# Altium footprint library Minh_Lib.PcbLib: 141 footprints (part 4 of 9)
Each footprint in its own frame and in the unit in brackets; x right, y up, seen from the top. Pads: shape width x height; smd on the part's side, far side on the other; paste and mask are expansions set on the pad; w line width, h text height; cw(c..) or ccw(c..) is an arc to the next point about the centre after c.
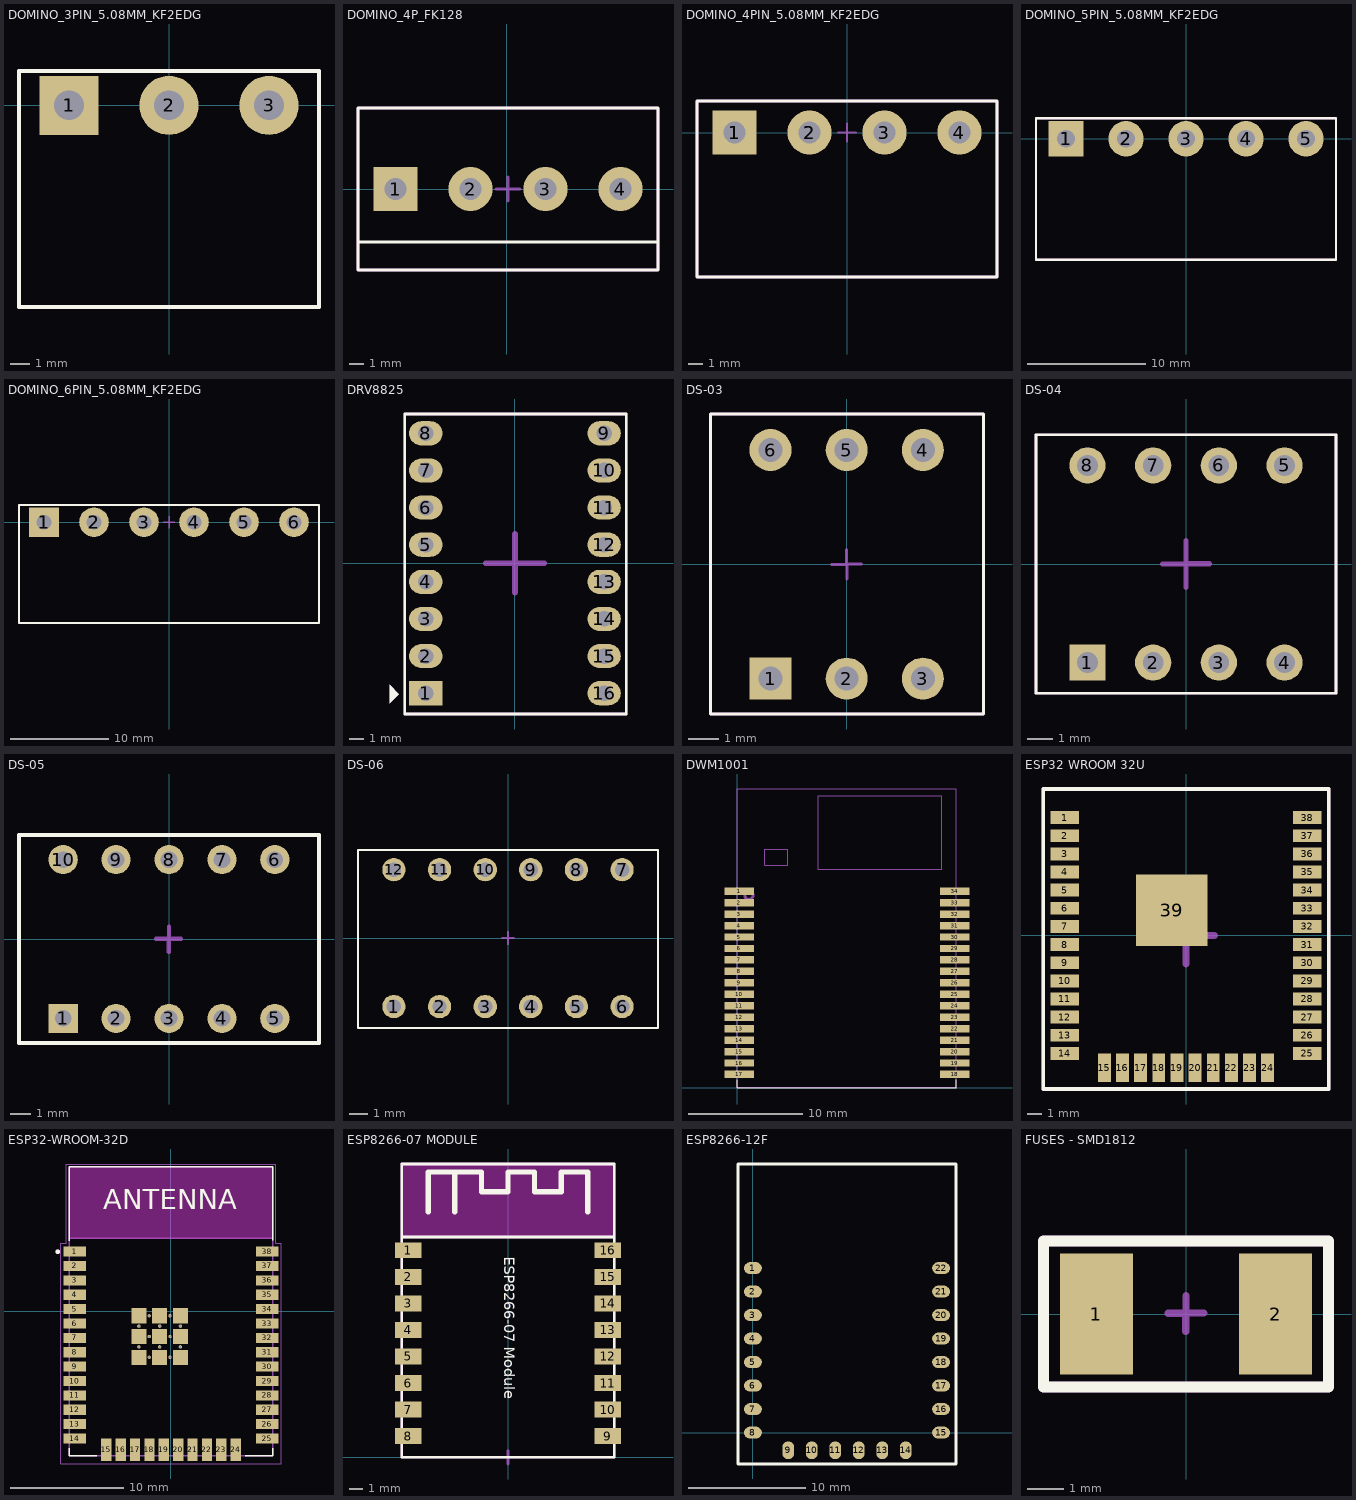
[diagram p3: the footprints below, top view; thin cyan lines are the x and y axes]

## DOMINO_3PIN_5.08MM_KF2EDG [mm] "KF2EDG"
pads (5):
  rect 3x3 hole 1.5: 1(-5.08,0) 1(-5.08,0)
  round 3 hole 1.5: 2(0,0) 2(0,0) 3(5.08,0)
Top Overlay:
  lines w0.2: -7.62,-10.25 7.62,-10.25 7.62,1.75 -7.62,1.75 -7.62,-10.25
Mechanical 13:
  lines w0.2: -7.62,-10.25 7.62,-10.25 7.62,1.75 -7.62,1.75 -7.62,-10.25
  text "'.Designator'" at -7.52,-4.58 h1.2
Mechanical 15:
  lines w0.15: -0.598,-0.002 0.002,-0.002 ; 0,-0.6 0,0 0,0.6 ; 0,-0.002 0.6,-0.002
3D body "User Library-BigHeader 5EHDR_1P.step": height 3.15, standoff -9.32, extent 2.58,-10.25 7.58,1.75
3D body "User Library-BigHeader 5EHDR_1P.step": height 3.15, standoff -9.32, extent -2.5,-10.25 2.5,1.75
3D body "User Library-BigHeader 5EHDR_1P.step": height 3.15, standoff -9.32, extent -7.58,-10.25 -2.58,1.75

## DOMINO_4P_FK128 [mm] "DOMINO 3P FK128"
pads (4):
  rect 3x3 hole 1.5: 1(-7.52,0)
  round 3 hole 1.5: 2(-2.44,0) 3(2.64,0) 4(7.72,0)
Top Overlay:
  lines w0.2: -10,-3.6 10.2,-3.6 ; -10.06,-5.5 10.26,-5.5 10.26,5.5 -10.06,5.5 -10.06,-5.5
Mechanical 13:
  lines w0.2: -10.06,-5.5 10.26,-5.5 10.26,5.5 -10.06,5.5 -10.06,-5.5
  text "'.Designator'" at -9.96,-4.58 h1.2
Mechanical 15:
  lines w0.2: -0.7,0 0.1,0 ; 0.1,-0.8 0.1,0 ; 0.1,0.8 0.1,0 ; 0.9,0 0.1,0
3D body "KF128-5.08-4P.STEP": height 14.16, standoff -3.79, extent -10.42,-5.15 10.5,5.15

## DOMINO_4PIN_5.08MM_KF2EDG [mm] "KF2EDG"
pads (6):
  rect 3x3 hole 1.5: 1(-7.62,0) 1(-7.62,0)
  round 3 hole 1.5: 2(-2.54,0) 2(-2.54,0) 3(2.54,0) 4(7.62,0)
Top Overlay:
  lines w0.2: -10.16,-9.8 10.16,-9.8 10.16,2.15 -10.16,2.15 -10.16,-9.8
Mechanical 13:
  lines w0.2: -10.16,-9.8 10.16,-9.8 10.16,2.15 -10.16,2.15 -10.16,-9.8
  text "'.Designator'" at -9.55,-8.15 h1.5
Mechanical 15:
  lines w0.15: -0.598,-0.002 0.002,-0.002 ; 0,-0.6 0,0 0,0.6 ; 0,-0.002 0.6,-0.002
3D body "Header 200mil.STEP": height 8.3, standoff -3.9, extent -0.01,-9.94 10.15,2.06
3D body "Header 200mil.STEP": height 8.3, standoff -3.9, extent -10.16,-9.94 0,2.06
3D body "Plug 200mil.STEP": height 14.95, standoff -0.05, extent -10.15,-18.95 0.01,-0.75
3D body "Plug 200mil.STEP": height 14.95, standoff -0.05, extent 0,-18.95 10.16,-0.75

## DOMINO_5PIN_5.08MM_KF2EDG [mm] "KF2EDG"
pads (7):
  rect 3x3 hole 1.5: 1(-10.16,0) 1(-10.16,0)
  round 3 hole 1.5: 2(-5.08,0) 2(-5.08,0) 3(0,0) 4(5.08,0) 5(10.16,0)
Top Overlay:
  lines w0.2: 12.7,-7.62 12.7,0 ; 12.7,-7.25 12.7,-10.25 -12.7,-10.25 -12.7,1.75 12.7,1.75 12.7,-1.25
Mechanical 13:
  lines w0.2: -12.7,-10.252 -12.7,1.748 12.7,1.748 12.7,-10.252 -12.7,-10.252
  text "'.Designator'" at -12.6,-4.48 h1.5
Mechanical 15:
  lines w0.15: -0.598,-0.002 0.002,-0.002 ; 0,-0.6 0,0 0,0.6 ; 0,-0.002 0.6,-0.002
3D body "User Library-BigHeader 5EHDR_1P.step": height 3.15, standoff -9.32, extent -12.66,-10.25 -7.66,1.75
3D body "User Library-BigHeader 5EHDR_1P.step": height 3.15, standoff -9.32, extent -7.58,-10.25 -2.58,1.75
3D body "User Library-BigHeader 5EHDR_1P.step": height 3.15, standoff -9.32, extent -2.5,-10.25 2.5,1.75
3D body "User Library-BigHeader 5EHDR_1P.step": height 3.15, standoff -9.32, extent 2.58,-10.25 7.58,1.75
3D body "User Library-BigHeader 5EHDR_1P.step": height 3.15, standoff -9.32, extent 7.66,-10.25 12.66,1.75

## DOMINO_6PIN_5.08MM_KF2EDG [mm] "KF2EDG"
pads (8):
  rect 3x3 hole 1.5: 1(-12.7,0) 1(-12.7,0)
  round 3 hole 1.5: 2(-7.62,0) 2(-7.62,0) 3(-2.54,0) 4(2.54,0) 5(7.62,0) 6(12.7,0)
Top Overlay:
  lines w0.2: 15.24,-7.62 15.24,1.75 -15.24,1.75 -15.24,-10.25 15.24,-10.25 15.24,-7.25
Mechanical 13:
  lines w0.2: -15.24,-10.252 -15.24,1.748 15.24,1.748 15.24,-10.252 -15.24,-10.252
  text "'.Designator'" at -15.14,-4.48 h1.5
Mechanical 15:
  lines w0.15: -0.598,-0.002 0.002,-0.002 ; 0,-0.6 0,0 0,0.6 ; 0,-0.002 0.6,-0.002
3D body "User Library-BigHeader 5EHDR_1P.step": height 3.15, standoff -9.32, extent -15.2,-10.25 -10.2,1.75
3D body "User Library-BigHeader 5EHDR_1P.step": height 3.15, standoff -9.32, extent -10.12,-10.25 -5.12,1.75
3D body "User Library-BigHeader 5EHDR_1P.step": height 3.15, standoff -9.32, extent -5.04,-10.25 -0.04,1.75
3D body "User Library-BigHeader 5EHDR_1P.step": height 3.15, standoff -9.32, extent 0.04,-10.25 5.04,1.75
3D body "User Library-BigHeader 5EHDR_1P.step": height 3.15, standoff -9.32, extent 5.12,-10.25 10.12,1.75
3D body "User Library-BigHeader 5EHDR_1P.step": height 3.15, standoff -9.32, extent 10.2,-10.25 15.2,1.75

## DRV8825 [mil]
pads (16):
  rect 90x65 hole 42: 1(-240,-350)
  oval 90x65 hole 42: 2(-240,-250) 3(-240,-150) 4(-240,-50) 5(-240,50) 6(-240,150) 7(-240,250) 8(-240,350) 9(240,350) 10(240,250) 11(240,150) 12(240,50) 13(240,-50) 14(240,-150) 15(240,-250) 16(240,-350)
Top Overlay:
  region: -312.5,-352.5 -337.5,-327.5 -337.5,-377.5
  lines w7: 183,-406 300,-406 ; 300,-406 -297,-406 -297,402 300,402 300,-406
Mechanical 13:
  region: -312.5,-352.5 -337.5,-327.5 -337.5,-377.5
  lines w7: 183,-406 300,-406 ; 300,-406 -297,-406 -297,402 300,402 300,-406
  text "'.Designator'" at 153.54,-417.32 h70.87
Mechanical 15:
  lines w15.75: -78.74,0 0,0 ; 0,-78.74 0,0 ; 0,78.74 0,0 ; 78.74,0 0,0
3D body "User Library-Header _Fem_1X8.step": height 334.65, standoff -125.98, extent 190.32,-409.45 290.32,410.24
3D body "Driver DRV8825.stp": height 583.46, standoff 3.01, extent -291.18,-401.18 299.37,398.82
3D body "User Library-Header _Fem_1X8.step": height 334.65, standoff -125.98, extent -293.94,-409.45 -193.94,410.24

## DS-03 [mm] "Dip Switch  - 3P"
pads (6):
  rect 1.4x1.4 hole 0.8: 1(-2.54,-3.81)
  round 1.4 hole 0.8: 2(0,-3.81) 3(2.54,-3.81) 4(2.54,3.81) 5(0,3.81) 6(-2.54,3.81)
Top Overlay:
  lines w0.1: -4.54,-4.99 4.56,-4.99 4.56,5.01 -4.54,5.01 -4.54,-4.99
Mechanical 13:
  lines w0.1: -4.54,-4.99 4.56,-4.99 4.56,5.01 -4.54,5.01 -4.54,-4.99
  text "'.Designator'" at -4.6,-0.9 h1.2
Mechanical 15:
  lines w0.1: -0.5,0 0,0 0,0.5 ; 0.001,0.011 0.501,0.011 ; 0.004,-0.489 0.004,0.011
3D body "DS1040-03 (DIP_switch).stp": height 6.8, standoff -3.85, extent -4.54,-4.95 4.54,4.95

## DS-04 [mm] "Dip Switch  - 4P"
pads (8):
  rect 1.4x1.4 hole 0.8: 1(-3.81,-3.81)
  round 1.4 hole 0.8: 2(-1.27,-3.81) 3(1.27,-3.81) 4(3.81,-3.81) 5(3.81,3.81) 6(1.27,3.81) 7(-1.27,3.81) 8(-3.81,3.81)
Top Overlay:
  lines w0.1: -5.8,-5 5.8,-5 5.8,5 -5.8,5 -5.8,-5
Mechanical 13:
  lines w0.1: -5.8,-5 5.8,-5 5.8,5 -5.8,5 -5.8,-5
  text "'.Designator'" at -5.8,-0.9 h1.2
Mechanical 15:
  lines w0.2: -0.9,0 0,0 0,0.9 ; 0,0.009 0.9,0.009 ; 0.006,-0.903 0.006,-0.003
3D body "DS1040-04 (DIP_switch).stp": height 6.8, standoff -3.85, extent -5.82,-4.95 5.8,4.95

## DS-05 [mm] "Dip Switch  - 5P"
pads (10):
  rect 1.4x1.4 hole 0.8: 1(-5.08,-3.81)
  round 1.4 hole 0.8: 2(-2.54,-3.81) 3(0,-3.81) 4(2.54,-3.81) 5(5.08,-3.81) 6(5.08,3.81) 7(2.54,3.81) 8(0,3.81) 9(-2.54,3.81) 10(-5.08,3.81)
Top Overlay:
  lines w0.2: -7.2,-5 -7.2,5 7.2,5 7.2,-5 -7.2,-5
Mechanical 13:
  lines w0.2: -7.2,-5 -7.2,5 7.2,5 7.2,-5 -7.2,-5
  text "'.Designator'" at -7,-1 h1.2
Mechanical 15:
  lines w0.2: -0.627,0.013 -0.027,0.013 0.573,0.013 ; -0.013,-0.627 -0.013,-0.027 ; 0,0 0,0.6
3D body "DS1040-05 (DIP_switch).stp": height 6.8, standoff -3.85, extent -7.08,-4.95 7.08,4.95

## DS-06 [mm]
pads (12):
  round 1.3 hole 0.8: 1(-6.35,-3.81) 2(-3.81,-3.81) 3(-1.27,-3.81) 4(1.27,-3.81) 5(3.81,-3.81) 6(6.35,-3.81) 7(6.35,3.81) 8(3.81,3.81) 9(1.27,3.81) 10(-1.27,3.81) 11(-3.81,3.81) 12(-6.35,3.81)
Top Overlay:
  lines w0.1: -8.35,-5 -8.35,4.9 8.35,4.9 8.35,-5 -8.35,-5
Mechanical 13:
  text "'.Designator'" at -7.9,-3.1 h1.5
Mechanical 15:
  lines w0.1: -0.35,0 0,0 0,0.35 ; -0.004,-0.343 -0.004,0.007 ; -0.004,0 0.346,0
3D body "DS1040-06 (DIP_switch).stp": height 6.8, standoff -3.85, extent -8.35,-4.99 8.35,4.91

## DWM1001 [mm] "DWM1001 MODULE"
height 4
pads (34):
  rect 2.54x0.65 smd: 1(0.16,17.15) 2(0.16,16.15) 3(0.16,15.15) 4(0.16,14.15) 5(0.16,13.15) 6(0.16,12.15) 7(0.16,11.15) 8(0.16,10.15) 9(0.16,9.15) 10(0.16,8.15) 11(0.16,7.15) 12(0.16,6.15) 13(0.16,5.15) 14(0.16,4.15) 15(0.16,3.15) 16(0.16,2.15) 17(0.16,1.15) 18(18.97,1.15) 19(18.97,2.15) 20(18.97,3.15) 21(18.97,4.15) 22(18.97,5.15) 23(18.97,6.15) 24(18.97,7.15) 25(18.97,8.15) 26(18.97,9.15) 27(18.97,10.15) 28(18.97,11.15) 29(18.97,12.15) 30(18.97,13.15) 31(18.97,14.15) 32(18.97,15.15) 33(18.97,16.15) 34(18.97,17.15)
Top Overlay:
  lines w0.1: 0,0.7 0,0 19.1,0 19.1,0.7
Mechanical 1:
  lines w0.1: 0,0 0,26.075 19.1,26.075 19.1,0.025 0,0.025 0,0.9
Mechanical 16:
  circle w0.254: c1,16.8 r0.361
  lines w0.1: 0,0.025 19.1,0.025 19.1,26.075 0,26.075 0,0.025 ; 2.4,19.4 4.4,19.4 4.4,20.8 2.4,20.8 2.4,19.4 ; 7.075,19.05 17.85,19.05 17.85,25.475 7.075,25.475 7.075,19.05
Mechanical 29:
  text ".Designator" at 5.6,11.6 h0.8
3D body "dm1_b2_V2.step": height 4.6, standoff 0.03, extent 0,0 19.125,26.125

## ESP32 WROOM 32U [mm]
pads (39):
  rect 2x0.9 smd: 1(-8.5,8.255) 2(-8.5,6.985) 3(-8.5,5.715) 4(-8.5,4.445) 5(-8.5,3.175) 6(-8.5,1.905) 7(-8.5,0.635) 8(-8.5,-0.635) 9(-8.5,-1.905) 10(-8.5,-3.175) 11(-8.5,-4.445) 12(-8.5,-5.715) 13(-8.5,-6.985) 14(-8.5,-8.255) 25(8.5,-8.255) 26(8.5,-6.985) 27(8.5,-5.715) 28(8.5,-4.445) 29(8.5,-3.175) 30(8.5,-1.905) 31(8.5,-0.635) 32(8.5,0.635) 33(8.5,1.905) 34(8.5,3.175) 35(8.5,4.445) 36(8.5,5.715) 37(8.5,6.985) 38(8.5,8.255)
  rect 0.9x2 smd: 15(-5.715,-9.255) 16(-4.445,-9.255) 17(-3.175,-9.255) 18(-1.905,-9.255) 19(-0.635,-9.255) 20(0.635,-9.255) 21(1.905,-9.255) 22(3.175,-9.255) 23(4.445,-9.255) 24(5.715,-9.255)
  rect 5x5 smd: 39(-1,1.755)
Top Overlay:
  lines w0.254: -10,-10.745 -10,10.255 10,10.255 10,-10.745 -10,-10.745
Mechanical 13:
  text "'.Designator'" at -7.7,-5.7 h3
Mechanical 15:
  lines w0.254: -10,-10.745 -10,10.255 10,10.255 10,-10.745 -10,-10.745
  lines w0.5: -2,0 0,0 ; 0,-2 0,0 ; 0,2 0,0 ; 2,0 0,0
3D body "ESp32-WROOM-32U v3.step": height 3.4, standoff -0.04, extent -9.045,-9.785 9.025,9.455

## ESP32-WROOM-32D [mm] "ESP32-WROOM-32D"
pads (59):
  rect 2x0.9 smd: 1(-8.5,5.26) 2(-8.5,3.99) 3(-8.5,2.72) 4(-8.5,1.45) 5(-8.5,0.18) 6(-8.5,-1.09) 7(-8.5,-2.36) 8(-8.5,-3.63) 9(-8.5,-4.9) 10(-8.5,-6.17) 11(-8.5,-7.44) 12(-8.5,-8.71) 13(-8.5,-9.98) 14(-8.5,-11.25) 25(8.5,-11.25) 26(8.5,-9.98) 27(8.5,-8.71) 28(8.5,-7.44) 29(8.5,-6.17) 30(8.5,-4.9) 31(8.5,-3.63) 32(8.5,-2.36) 33(8.5,-1.09) 34(8.5,0.18) 35(8.5,1.45) 36(8.5,2.72) 37(8.5,3.99) 38(8.5,5.26)
  rect 0.9x2 smd: 15(-5.715,-12.25) 16(-4.445,-12.25) 17(-3.175,-12.25) 18(-1.905,-12.25) 19(-0.635,-12.25) 20(0.635,-12.25) 21(1.905,-12.25) 22(3.175,-12.25) 23(4.445,-12.25) 24(5.715,-12.25)
  rect 1.33x1.33 smd: 39_1(-2.835,-0.405) 39_2(-1,-0.405) 39_3(0.835,-0.405) 39_4(-2.835,-2.24) 39_5(-1,-2.24) 39_6(0.835,-2.24) 39_7(-2.835,-4.075) 39_8(-1,-4.075) 39_9(0.835,-4.075)
  round 0.3 hole 0.2: 39_10(-1.917,-0.405) 39_11(-0.082,-0.405) 39_12(-2.835,-1.322) 39_13(-1,-1.322) 39_14(0.835,-1.322) 39_15(-1.917,-2.24) 39_16(-0.082,-2.24) 39_17(-2.835,-3.157) 39_18(-1,-3.157) 39_19(0.835,-3.157) 39_20(-1.917,-4.075) 39_21(-0.082,-4.075)
Top Overlay:
  circle w0.2: c-10,5.25 r0.1
  lines w0.127: -9,-12.1 -9,-12.75 -6.55,-12.75 ; -9,6.2 -9,12.75 9,12.75 ; 6.55,-12.75 9,-12.75 9,-12.1 ; 9,6.25 9,12.75 ; 9,6.45 9,12.75
  text "ANTENNA" at -6,9 h1.78
Keep-Out Layer:
  region: 9,6.45 -9,6.45 -9,12.75 9,12.75
  region: 9,6.45 -9,6.45 -9,12.75 9,12.75
Mechanical 1:
  text "ANTENNA" at -6,9 h1.78
Mechanical 13:
  circle w0.2: c-10,5.25 r0.1
  lines w0.127: -9,-12.1 -9,-12.75 ; -6.55,-12.75 -9,-12.75 ; 6.55,-12.75 9,-12.75 ; 9,-12.1 9,-12.75 ; 9,6.25 9,12.75 ; -9,-12.75 9,-12.75 ; -9,-12.75 -9,6.45 ; -9,6.45 9,6.45 ; -9,6.45 -9,12.75 9,12.75 ; 9,-12.75 9,6.45 ; 9,6.45 9,12.75
  text "'.Designator'" at -9.39,-12.19 h3
Mechanical 15:
  lines w0.05: -9.75,-13.5 9.75,-13.5 9.75,6 9.25,6 9.25,13 -9.25,13 -9.25,6 -9.75,6 -9.75,-13.5
3D body "User Library-ESP321.step": height 2.91, standoff -0.01, extent -8.99,-12.75 9.01,12.75

## ESP8266-07 MODULE [mm]
pads (16):
  rect 2x1.2 smd: 1(-7.5,15.6) 2(-7.5,13.6) 3(-7.5,11.6) 4(-7.5,9.6) 5(-7.5,7.6) 6(-7.5,5.6) 7(-7.5,3.6) 8(-7.5,1.6) 9(7.5,1.6) 10(7.5,3.6) 11(7.5,5.6) 12(7.5,7.6) 13(7.5,9.6) 14(7.5,11.6) 15(7.5,13.6) 16(7.5,15.6)
Top Overlay:
  lines w0.2: -8,16.6 8,16.6 ; -8,0 8,0 8,22.1 -8,22.1 -8,0
  lines w0.4: -6,18.5 -6,21.5 -4,21.5 ; -4,18.5 -4,21.5 ; 6,18.5 6,21.5 4,21.5 4,20 2,20 2,21.5 0,21.5 0,20 -2,20 -2,21.5 -4,21.5
  text "ESP8266-07 Module" at -0.3,15.1 h0.8
Keep-Out Layer:
  pour cut-out: -8,22.1 -8,16.6 8,16.6 8,22.1
Mechanical 13:
  lines w0.2: -8,16.6 8,16.6 ; -8,0 8,0 8,22.1 -8,22.1 -8,0
  text "'.Designator'" at -8,0 h1.2
  text "ESP8266-07 Module" at -0.3,15.1 h0.8
Mechanical 15:
  lines w0.2: -0.5,0 0,0 ; 0,-0.5 0,0 ; 0,0.5 0,0 ; 0.5,0 0,0
3D body "ESP07.STEP": height 3.51, standoff 0, extent -7.96,-0.06 8.04,21.94

## ESP8266-12F [mil]
pads (22):
  oval 60x40 smd: 1(0,551.18) 2(0,472.44) 3(0,393.7) 4(0,314.96) 5(0,236.22) 6(0,157.48) 7(0,78.74) 8(0,0) 15(630,0) 16(630,78.74) 17(630,157.48) 18(630,236.22) 19(630,314.96) 20(630,393.7) 21(630,472.44) 22(630,551.18)
  oval 40x60 smd: 9(118.11,-59.06) 10(196.85,-59.06) 11(275.59,-59.06) 12(354.33,-59.06) 13(433.07,-59.06) 14(511.81,-59.06)
Top Overlay:
  lines w10: -50,-105 -50,900 680,900 680,-105 -50,-105
3D body "User Library-EPS8266 ESP-12E-1.STEP": height 104.33, standoff -1.38, extent -0.16,-60 630.16,885.08

## FUSES - SMD1812 [mm] "4532/SMD1812"
pads (2):
  rect 2x3.3 smd: 1(-2.45,0) 2(2.45,0)
Top Overlay:
  lines w0.3: -3.9,-2 -3.9,2 -3.6,2 3.4,2 3.9,2 3.9,-2 -3.9,-2
Mechanical 13:
  lines w0.3: -3.9,-2 -3.9,2 -3.6,2 3.4,2 3.9,2 3.9,-2 -3.9,-2
  text "'.Designator'" at -3.7,-1.48 h1.2
Mechanical 15:
  lines w0.2: -0.492,0.021 0.008,0.021 ; -0.01,0.027 0.49,0.027 ; -0.004,-0.473 -0.004,0.027 ; 0,0 0,0.5
3D body "User Library-fuse1812.step": height 1.32, standoff 0, extent -2.41,-1.61 2.41,1.61